# Altium footprint library CONN_HDR_1.00MM_ST_SMD.PcbLib: 42 footprints (part 1 of 3)
Each footprint in its own frame and in the unit in brackets; x right, y up, seen from the top. Pads: shape width x height; smd on the part's side, far side on the other; paste and mask are expansions set on the pad; w line width, h text height; cw(c..) or ccw(c..) is an arc to the next point about the centre after c.
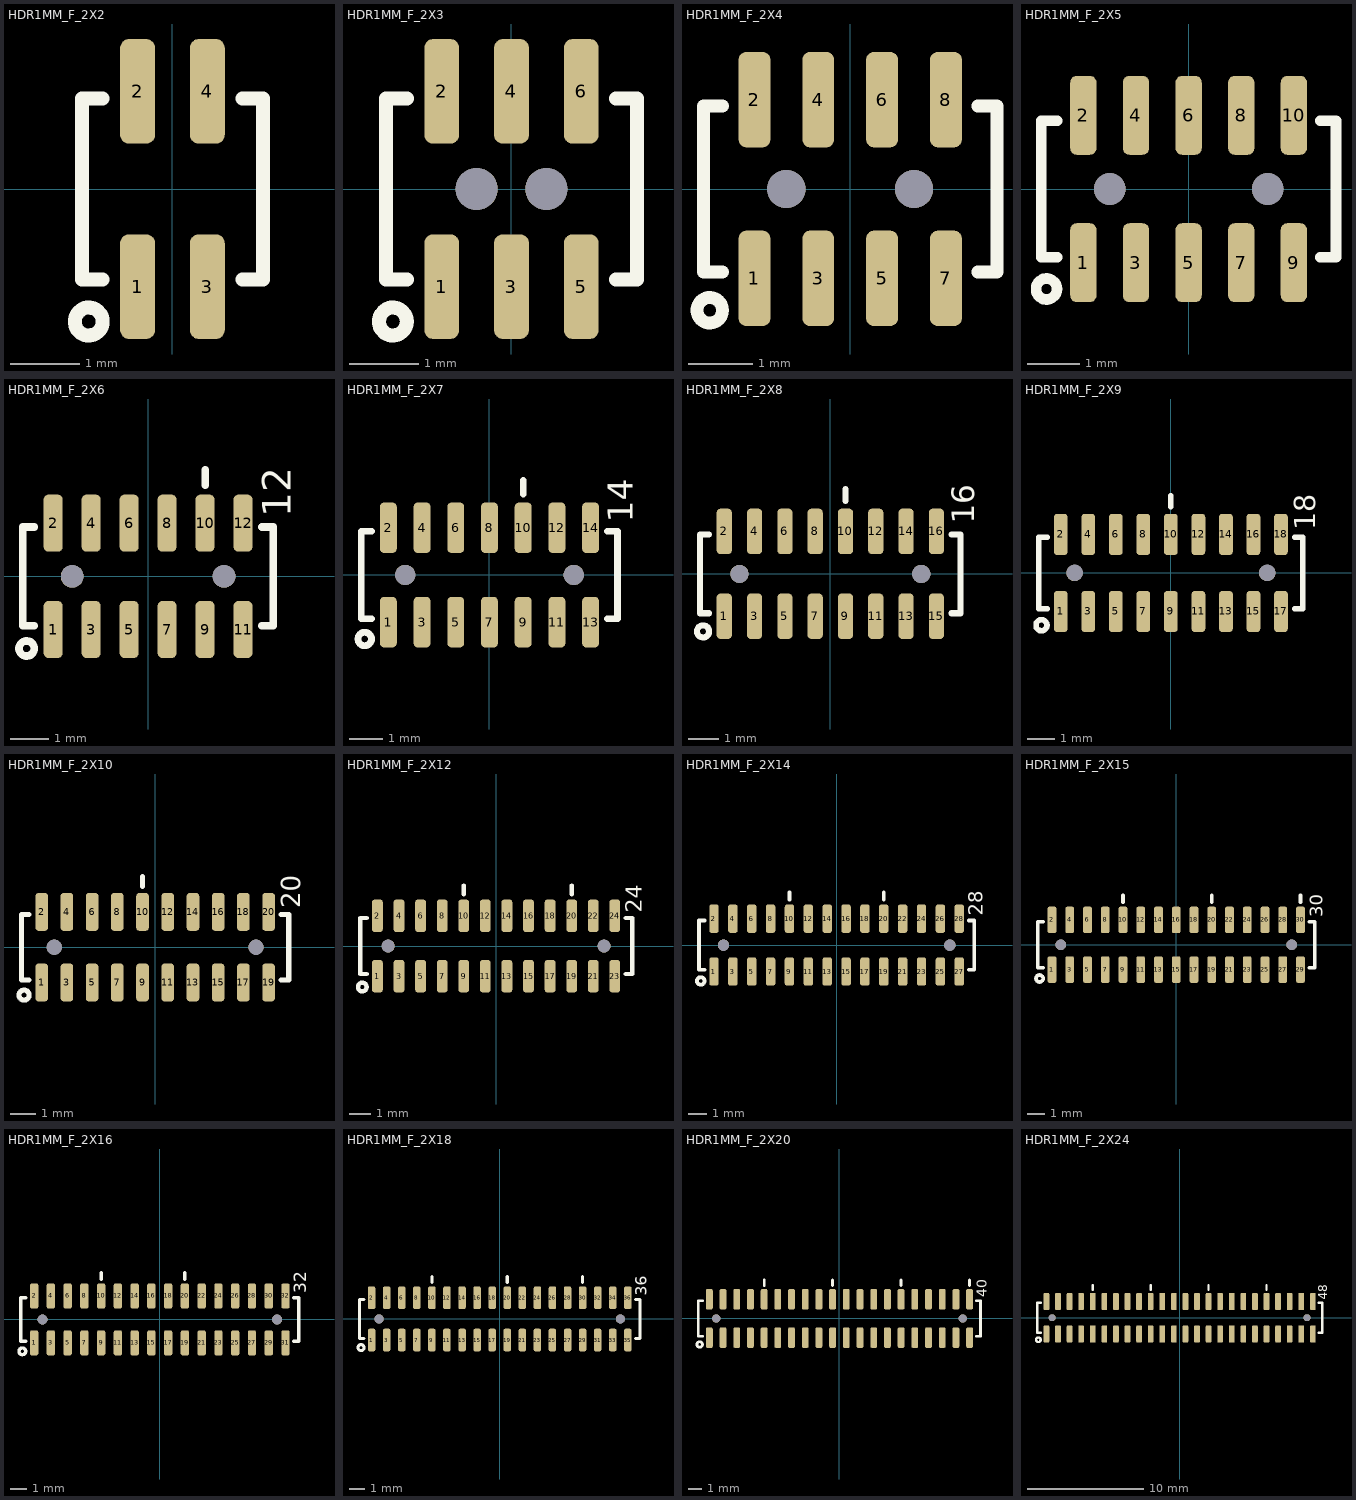
[diagram p0: the footprints below, top view; thin cyan lines are the x and y axes]

## HDR1MM_F_2X2 [mm] "HEADER, 1mm, SMD, GCT CO BC084 and BC085"
pads (4):
  rrect50% 0.5x1.5 smd mask+0.075: 1(-0.5,-1.4) 2(-0.5,1.4) 3(0.5,-1.4) 4(0.5,1.4)
Top Overlay:
  circle w0.2: c-1.2,-1.9 r0.2
  lines w0.2: -1,-1.3 -1.3,-1.3 -1.3,1.3 -1,1.3 ; 1,-1.3 1.3,-1.3 1.3,1.3 1,1.3
3D body "BC085-04-A-0390-L-C.stp": height 2.3, standoff 0.05, extent -1.25,-1.95 1.25,1.95

## HDR1MM_F_2X3 [mm] "HEADER, 1mm, SMD, GCT CO BC084 and BC085"
pads (8):
  rrect50% 0.5x1.5 smd mask+0.075: 1(-1,-1.4) 2(-1,1.4) 3(0,-1.4) 4(0,1.4) 5(1,-1.4) 6(1,1.4)
  round 0.6 hole 0.6 unplated: ""(-0.5,0) ""(0.5,0)
Top Overlay:
  circle w0.2: c-1.7,-1.9 r0.2
  lines w0.2: -1.5,-1.3 -1.8,-1.3 -1.8,1.3 -1.5,1.3 ; 1.5,-1.3 1.8,-1.3 1.8,1.3 1.5,1.3
3D body "BC084-06-A-0390-L-C.stp": height 2.3, standoff -0.5, extent -1.75,-1.95 1.75,1.95

## HDR1MM_F_2X4 [mm] "HEADER, 1mm, SMD, GCT CO BC084 and BC085"
pads (10):
  rrect50% 0.5x1.5 smd mask+0.075: 1(-1.5,-1.4) 2(-1.5,1.4) 3(-0.5,-1.4) 4(-0.5,1.4) 5(0.5,-1.4) 6(0.5,1.4) 7(1.5,-1.4) 8(1.5,1.4)
  round 0.6 hole 0.6 unplated: ""(-1,0) ""(1,0)
Top Overlay:
  circle w0.2: c-2.2,-1.9 r0.2
  lines w0.2: -2,-1.3 -2.3,-1.3 -2.3,1.3 -2,1.3 ; 2,-1.3 2.3,-1.3 2.3,1.3 2,1.3
3D body "BC084-08-A-0390-L-C.stp": height 2.3, standoff -0.5, extent -2.25,-1.95 2.25,1.95

## HDR1MM_F_2X5 [mm] "HEADER, 1mm, SMD, GCT CO BC084 and BC085"
pads (12):
  rrect50% 0.5x1.5 smd mask+0.075: 1(-2,-1.4) 2(-2,1.4) 3(-1,-1.4) 4(-1,1.4) 5(0,-1.4) 6(0,1.4) 7(1,-1.4) 8(1,1.4) 9(2,-1.4) 10(2,1.4)
  round 0.6 hole 0.6 unplated: ""(-1.5,0) ""(1.5,0)
Top Overlay:
  circle w0.2: c-2.7,-1.9 r0.2
  lines w0.2: -2.5,-1.3 -2.8,-1.3 -2.8,1.3 -2.5,1.3 ; 2.5,-1.3 2.8,-1.3 2.8,1.3 2.5,1.3
3D body "BC084-10-A-0390-L-C.stp": height 2.3, standoff -0.5, extent -2.75,-1.95 2.75,1.95

## HDR1MM_F_2X6 [mm] "HEADER, 1mm, SMD, GCT CO BC084 and BC085"
pads (14):
  rrect50% 0.5x1.5 smd mask+0.075: 1(-2.5,-1.4) 2(-2.5,1.4) 3(-1.5,-1.4) 4(-1.5,1.4) 5(-0.5,-1.4) 6(-0.5,1.4) 7(0.5,-1.4) 8(0.5,1.4) 9(1.5,-1.4) 10(1.5,1.4) 11(2.5,-1.4) 12(2.5,1.4)
  round 0.6 hole 0.6 unplated: ""(-2,0) ""(2,0)
Top Overlay:
  circle w0.2: c-3.2,-1.9 r0.2
  lines w0.2: -3,-1.3 -3.3,-1.3 -3.3,1.3 -3,1.3 ; 1.5,2.4 1.5,2.8 ; 3,-1.3 3.3,-1.3 3.3,1.3 3,1.3
  text "12" at 3.75,1.55 h0.75
3D body "BC084-12-A-0390-L-C.stp": height 2.3, standoff -0.5, extent -3.25,-1.95 3.25,1.95

## HDR1MM_F_2X7 [mm] "HEADER, 1mm, SMD, GCT CO BC084 and BC085"
pads (16):
  rrect50% 0.5x1.5 smd mask+0.075: 1(-3,-1.4) 2(-3,1.4) 3(-2,-1.4) 4(-2,1.4) 5(-1,-1.4) 6(-1,1.4) 7(0,-1.4) 8(0,1.4) 9(1,-1.4) 10(1,1.4) 11(2,-1.4) 12(2,1.4) 13(3,-1.4) 14(3,1.4)
  round 0.6 hole 0.6 unplated: ""(-2.5,0) ""(2.5,0)
Top Overlay:
  circle w0.2: c-3.7,-1.9 r0.2
  lines w0.2: -3.5,-1.3 -3.8,-1.3 -3.8,1.3 -3.5,1.3 ; 1,2.4 1,2.8 ; 3.5,-1.3 3.8,-1.3 3.8,1.3 3.5,1.3
  text "14" at 4.25,1.55 h0.75
3D body "BC084-14-A-0390-L-C.stp": height 2.3, standoff -0.5, extent -3.75,-1.95 3.75,1.95

## HDR1MM_F_2X8 [mm] "HEADER, 1mm, SMD, GCT CO BC084 and BC085"
pads (18):
  rrect50% 0.5x1.5 smd mask+0.075: 1(-3.5,-1.4) 2(-3.5,1.4) 3(-2.5,-1.4) 4(-2.5,1.4) 5(-1.5,-1.4) 6(-1.5,1.4) 7(-0.5,-1.4) 8(-0.5,1.4) 9(0.5,-1.4) 10(0.5,1.4) 11(1.5,-1.4) 12(1.5,1.4) 13(2.5,-1.4) 14(2.5,1.4) 15(3.5,-1.4) 16(3.5,1.4)
  round 0.6 hole 0.6 unplated: ""(-3,0) ""(3,0)
Top Overlay:
  circle w0.2: c-4.2,-1.9 r0.2
  lines w0.2: -4,-1.3 -4.3,-1.3 -4.3,1.3 -4,1.3 ; 0.5,2.4 0.5,2.8 ; 4,-1.3 4.3,-1.3 4.3,1.3 4,1.3
  text "16" at 4.75,1.65 h0.75
3D body "BC084-16-A-0390-L-C.stp": height 2.3, standoff -0.5, extent -4.25,-1.95 4.25,1.95

## HDR1MM_F_2X9 [mm] "HEADER, 1mm, SMD, GCT CO BC084 and BC085"
pads (20):
  rrect50% 0.5x1.5 smd mask+0.075: 1(-4,-1.4) 2(-4,1.4) 3(-3,-1.4) 4(-3,1.4) 5(-2,-1.4) 6(-2,1.4) 7(-1,-1.4) 8(-1,1.4) 9(0,-1.4) 10(0,1.4) 11(1,-1.4) 12(1,1.4) 13(2,-1.4) 14(2,1.4) 15(3,-1.4) 16(3,1.4) 17(4,-1.4) 18(4,1.4)
  round 0.6 hole 0.6 unplated: ""(-3.5,0) ""(3.5,0)
Top Overlay:
  circle w0.2: c-4.7,-1.9 r0.2
  lines w0.2: -4.5,-1.3 -4.8,-1.3 -4.8,1.3 -4.5,1.3 ; 0,2.4 0,2.8 ; 4.5,-1.3 4.8,-1.3 4.8,1.3 4.5,1.3
  text "18" at 5.25,1.55 h0.75
3D body "BC084-18-A-0390-L-C.stp": height 2.3, standoff -0.5, extent -4.75,-1.95 4.75,1.95

## HDR1MM_F_2X10 [mm] "HEADER, 1mm, SMD, GCT CO BC084 and BC085"
pads (22):
  rrect50% 0.5x1.5 smd mask+0.075: 1(-4.5,-1.4) 2(-4.5,1.4) 3(-3.5,-1.4) 4(-3.5,1.4) 5(-2.5,-1.4) 6(-2.5,1.4) 7(-1.5,-1.4) 8(-1.5,1.4) 9(-0.5,-1.4) 10(-0.5,1.4) 11(0.5,-1.4) 12(0.5,1.4) 13(1.5,-1.4) 14(1.5,1.4) 15(2.5,-1.4) 16(2.5,1.4) 17(3.5,-1.4) 18(3.5,1.4) 19(4.5,-1.4) 20(4.5,1.4)
  round 0.6 hole 0.6 unplated: ""(-4,0) ""(4,0)
Top Overlay:
  circle w0.2: c-5.2,-1.9 r0.2
  lines w0.2: -5,-1.3 -5.3,-1.3 -5.3,1.3 -5,1.3 ; -0.5,2.4 -0.5,2.8 ; 5,-1.3 5.3,-1.3 5.3,1.3 5,1.3
  text "20" at 5.75,1.55 h0.75
3D body "BC084-20-A-0390-L-C.stp": height 2.3, standoff -0.5, extent -5.25,-1.95 5.25,1.95

## HDR1MM_F_2X12 [mm] "HEADER, 1mm, SMD, GCT CO BC084 and BC085"
pads (26):
  rrect50% 0.5x1.5 smd mask+0.075: 1(-5.5,-1.4) 2(-5.5,1.4) 3(-4.5,-1.4) 4(-4.5,1.4) 5(-3.5,-1.4) 6(-3.5,1.4) 7(-2.5,-1.4) 8(-2.5,1.4) 9(-1.5,-1.4) 10(-1.5,1.4) 11(-0.5,-1.4) 12(-0.5,1.4) 13(0.5,-1.4) 14(0.5,1.4) 15(1.5,-1.4) 16(1.5,1.4) 17(2.5,-1.4) 18(2.5,1.4) 19(3.5,-1.4) 20(3.5,1.4) 21(4.5,-1.4) 22(4.5,1.4) 23(5.5,-1.4) 24(5.5,1.4)
  round 0.6 hole 0.6 unplated: ""(-5,0) ""(5,0)
Top Overlay:
  circle w0.2: c-6.2,-1.9 r0.2
  lines w0.2: -6,-1.3 -6.3,-1.3 -6.3,1.3 -6,1.3 ; -1.5,2.4 -1.5,2.8 ; 3.5,2.4 3.5,2.8 ; 6,-1.3 6.3,-1.3 6.3,1.3 6,1.3
  text "24" at 6.75,1.55 h0.75
3D body "BC084-24-A-0390-L-C.stp": height 2.3, standoff -0.5, extent -6.25,-1.95 6.25,1.95

## HDR1MM_F_2X14 [mm] "HEADER, 1mm, SMD, GCT CO BC084 and BC085"
pads (30):
  rrect50% 0.5x1.5 smd mask+0.075: 1(-6.5,-1.4) 2(-6.5,1.4) 3(-5.5,-1.4) 4(-5.5,1.4) 5(-4.5,-1.4) 6(-4.5,1.4) 7(-3.5,-1.4) 8(-3.5,1.4) 9(-2.5,-1.4) 10(-2.5,1.4) 11(-1.5,-1.4) 12(-1.5,1.4) 13(-0.5,-1.4) 14(-0.5,1.4) 15(0.5,-1.4) 16(0.5,1.4) 17(1.5,-1.4) 18(1.5,1.4) 19(2.5,-1.4) 20(2.5,1.4) 21(3.5,-1.4) 22(3.5,1.4) 23(4.5,-1.4) 24(4.5,1.4) 25(5.5,-1.4) 26(5.5,1.4) 27(6.5,-1.4) 28(6.5,1.4)
  round 0.6 hole 0.6 unplated: ""(-6,0) ""(6,0)
Top Overlay:
  circle w0.2: c-7.2,-1.9 r0.2
  lines w0.2: -7,-1.3 -7.3,-1.3 -7.3,1.3 -7,1.3 ; -2.5,2.4 -2.5,2.8 ; 2.5,2.4 2.5,2.8 ; 7,-1.3 7.3,-1.3 7.3,1.3 7,1.3
  text "28" at 7.75,1.55 h0.75
3D body "BC084-28-A-0390-L-C.stp": height 2.3, standoff -0.5, extent -7.25,-1.95 7.25,1.95

## HDR1MM_F_2X15 [mm] "HEADER, 1mm, SMD, GCT CO BC084 and BC085"
pads (32):
  rrect50% 0.5x1.5 smd mask+0.075: 1(-7,-1.4) 2(-7,1.4) 3(-6,-1.4) 4(-6,1.4) 5(-5,-1.4) 6(-5,1.4) 7(-4,-1.4) 8(-4,1.4) 9(-3,-1.4) 10(-3,1.4) 11(-2,-1.4) 12(-2,1.4) 13(-1,-1.4) 14(-1,1.4) 15(0,-1.4) 16(0,1.4) 17(1,-1.4) 18(1,1.4) 19(2,-1.4) 20(2,1.4) 21(3,-1.4) 22(3,1.4) 23(4,-1.4) 24(4,1.4) 25(5,-1.4) 26(5,1.4) 27(6,-1.4) 28(6,1.4) 29(7,-1.4) 30(7,1.4)
  round 0.6 hole 0.6 unplated: ""(-6.5,0) ""(6.5,0)
Top Overlay:
  circle w0.2: c-7.7,-1.9 r0.2
  lines w0.2: -7.5,-1.3 -7.8,-1.3 -7.8,1.3 -7.5,1.3 ; -3,2.4 -3,2.8 ; 2,2.4 2,2.8 ; 7,2.4 7,2.8 ; 7.5,-1.3 7.8,-1.3 7.8,1.3 7.5,1.3
  text "30" at 8.25,1.55 h0.75
3D body "BC084-30-A-0390-L-C.stp": height 2.3, standoff -0.5, extent -7.75,-1.95 7.75,1.95

## HDR1MM_F_2X16 [mm] "HEADER, 1mm, SMD, GCT CO BC084 and BC085"
pads (34):
  rrect50% 0.5x1.5 smd mask+0.075: 1(-7.5,-1.4) 2(-7.5,1.4) 3(-6.5,-1.4) 4(-6.5,1.4) 5(-5.5,-1.4) 6(-5.5,1.4) 7(-4.5,-1.4) 8(-4.5,1.4) 9(-3.5,-1.4) 10(-3.5,1.4) 11(-2.5,-1.4) 12(-2.5,1.4) 13(-1.5,-1.4) 14(-1.5,1.4) 15(-0.5,-1.4) 16(-0.5,1.4) 17(0.5,-1.4) 18(0.5,1.4) 19(1.5,-1.4) 20(1.5,1.4) 21(2.5,-1.4) 22(2.5,1.4) 23(3.5,-1.4) 24(3.5,1.4) 25(4.5,-1.4) 26(4.5,1.4) 27(5.5,-1.4) 28(5.5,1.4) 29(6.5,-1.4) 30(6.5,1.4) 31(7.5,-1.4) 32(7.5,1.4)
  round 0.6 hole 0.6 unplated: ""(-7,0) ""(7,0)
Top Overlay:
  circle w0.2: c-8.2,-1.9 r0.2
  lines w0.2: -8,-1.3 -8.3,-1.3 -8.3,1.3 -8,1.3 ; -3.5,2.4 -3.5,2.8 ; 1.5,2.4 1.5,2.8 ; 8,-1.3 8.3,-1.3 8.3,1.3 8,1.3
  text "32" at 8.75,1.55 h0.75
3D body "BC084-32-A-0390-L-C.stp": height 2.3, standoff -0.5, extent -8.25,-1.95 8.25,1.95

## HDR1MM_F_2X18 [mm] "HEADER, 1mm, SMD, GCT CO BC084 and BC085"
pads (38):
  rrect50% 0.5x1.5 smd mask+0.075: 1(-8.5,-1.4) 2(-8.5,1.4) 3(-7.5,-1.4) 4(-7.5,1.4) 5(-6.5,-1.4) 6(-6.5,1.4) 7(-5.5,-1.4) 8(-5.5,1.4) 9(-4.5,-1.4) 10(-4.5,1.4) 11(-3.5,-1.4) 12(-3.5,1.4) 13(-2.5,-1.4) 14(-2.5,1.4) 15(-1.5,-1.4) 16(-1.5,1.4) 17(-0.5,-1.4) 18(-0.5,1.4) 19(0.5,-1.4) 20(0.5,1.4) 21(1.5,-1.4) 22(1.5,1.4) 23(2.5,-1.4) 24(2.5,1.4) 25(3.5,-1.4) 26(3.5,1.4) 27(4.5,-1.4) 28(4.5,1.4) 29(5.5,-1.4) 30(5.5,1.4) 31(6.5,-1.4) 32(6.5,1.4) 33(7.5,-1.4) 34(7.5,1.4) 35(8.5,-1.4) 36(8.5,1.4)
  round 0.6 hole 0.6 unplated: ""(-8,0) ""(8,0)
Top Overlay:
  circle w0.2: c-9.2,-1.9 r0.2
  lines w0.2: -9,-1.3 -9.3,-1.3 -9.3,1.3 -9,1.3 ; -4.5,2.4 -4.5,2.8 ; 0.5,2.4 0.5,2.8 ; 5.5,2.4 5.5,2.8 ; 9,-1.3 9.3,-1.3 9.3,1.3 9,1.3
  text "36" at 9.75,1.55 h0.75
3D body "BC084-36-A-0390-L-C.stp": height 2.3, standoff -0.5, extent -9.25,-1.95 9.25,1.95

## HDR1MM_F_2X20 [mm] "HEADER, 1mm, SMD, GCT CO BC084 and BC085"
pads (42):
  rrect50% 0.5x1.5 smd mask+0.075: 1(-9.5,-1.4) 2(-9.5,1.4) 3(-8.5,-1.4) 4(-8.5,1.4) 5(-7.5,-1.4) 6(-7.5,1.4) 7(-6.5,-1.4) 8(-6.5,1.4) 9(-5.5,-1.4) 10(-5.5,1.4) 11(-4.5,-1.4) 12(-4.5,1.4) 13(-3.5,-1.4) 14(-3.5,1.4) 15(-2.5,-1.4) 16(-2.5,1.4) 17(-1.5,-1.4) 18(-1.5,1.4) 19(-0.5,-1.4) 20(-0.5,1.4) 21(0.5,-1.4) 22(0.5,1.4) 23(1.5,-1.4) 24(1.5,1.4) 25(2.5,-1.4) 26(2.5,1.4) 27(3.5,-1.4) 28(3.5,1.4) 29(4.5,-1.4) 30(4.5,1.4) 31(5.5,-1.4) 32(5.5,1.4) 33(6.5,-1.4) 34(6.5,1.4) 35(7.5,-1.4) 36(7.5,1.4) 37(8.5,-1.4) 38(8.5,1.4) 39(9.5,-1.4) 40(9.5,1.4)
  round 0.6 hole 0.6 unplated: ""(-9,0) ""(9,0)
Top Overlay:
  circle w0.2: c-10.2,-1.9 r0.2
  lines w0.2: -10,-1.3 -10.3,-1.3 -10.3,1.3 -10,1.3 ; -5.5,2.4 -5.5,2.8 ; -0.5,2.4 -0.5,2.8 ; 4.5,2.4 4.5,2.8 ; 9.5,2.4 9.5,2.8 ; 10,-1.3 10.3,-1.3 10.3,1.3 10,1.3
  text "40" at 10.75,1.55 h0.75
3D body "BC084-40-A-0390-L-C.stp": height 2.3, standoff -0.5, extent -10.25,-1.95 10.25,1.95

## HDR1MM_F_2X24 [mm] "HEADER, 1mm, SMD, GCT CO BC084 and BC085"
pads (50):
  rrect50% 0.5x1.5 smd mask+0.075: 1(-11.5,-1.4) 2(-11.5,1.4) 3(-10.5,-1.4) 4(-10.5,1.4) 5(-9.5,-1.4) 6(-9.5,1.4) 7(-8.5,-1.4) 8(-8.5,1.4) 9(-7.5,-1.4) 10(-7.5,1.4) 11(-6.5,-1.4) 12(-6.5,1.4) 13(-5.5,-1.4) 14(-5.5,1.4) 15(-4.5,-1.4) 16(-4.5,1.4) 17(-3.5,-1.4) 18(-3.5,1.4) 19(-2.5,-1.4) 20(-2.5,1.4) 21(-1.5,-1.4) 22(-1.5,1.4) 23(-0.5,-1.4) 24(-0.5,1.4) 25(0.5,-1.4) 26(0.5,1.4) 27(1.5,-1.4) 28(1.5,1.4) 29(2.5,-1.4) 30(2.5,1.4) 31(3.5,-1.4) 32(3.5,1.4) 33(4.5,-1.4) 34(4.5,1.4) 35(5.5,-1.4) 36(5.5,1.4) 37(6.5,-1.4) 38(6.5,1.4) 39(7.5,-1.4) 40(7.5,1.4) 41(8.5,-1.4) 42(8.5,1.4) 43(9.5,-1.4) 44(9.5,1.4) 45(10.5,-1.4) 46(10.5,1.4) 47(11.5,-1.4) 48(11.5,1.4)
  round 0.6 hole 0.6 unplated: ""(-11,0) ""(11,0)
Top Overlay:
  circle w0.2: c-12.2,-1.9 r0.2
  lines w0.2: -12,-1.3 -12.3,-1.3 -12.3,1.3 -12,1.3 ; -7.5,2.4 -7.5,2.8 ; -2.5,2.4 -2.5,2.8 ; 2.5,2.4 2.5,2.8 ; 7.5,2.4 7.5,2.8 ; 12,-1.3 12.3,-1.3 12.3,1.3 12,1.3
  text "48" at 12.75,1.55 h0.75
3D body "BC084-48-A-0390-L-C.stp": height 2.3, standoff -0.5, extent -12.25,-1.95 12.25,1.95